# Altium footprint library PassiveComponents.PcbLib: 111 footprints (part 1 of 7)
Each footprint in its own frame and in the unit in brackets; x right, y up, seen from the top. Pads: shape width x height; smd on the part's side, far side on the other; paste and mask are expansions set on the pad; w line width, h text height; cw(c..) or ccw(c..) is an arc to the next point about the centre after c.
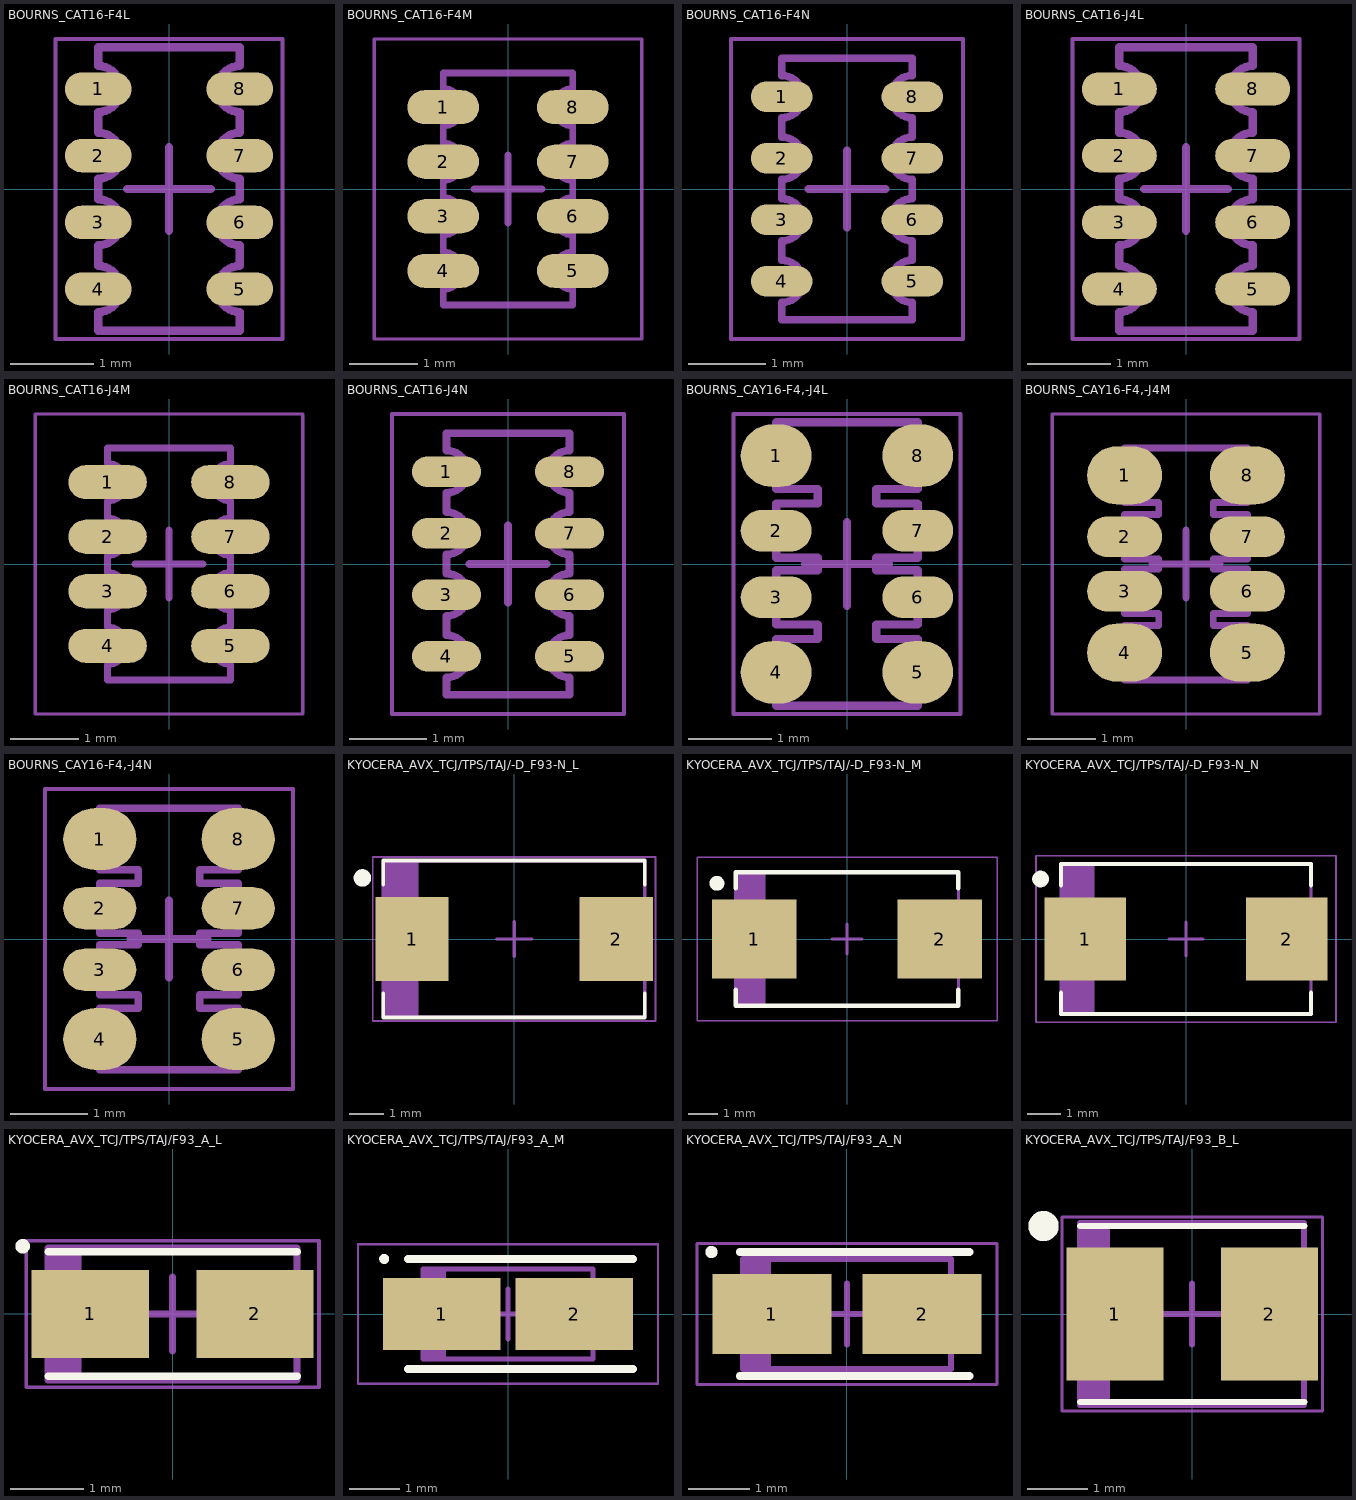
[diagram p0: the footprints below, top view; thin cyan lines are the x and y axes]

## BOURNS_CAT16-F4L [mm] "Chip Array, Concave, 8-Leads, Pitch 0.80mm,  Body 3.20x1.60mm,  IPC High Density"
height 0.6
pads (8):
  oval 0.8x0.4 smd mask+0.05: 1(-0.85,1.2) 2(-0.85,0.4) 3(-0.85,-0.4) 4(-0.85,-1.2) 5(0.85,-1.2) 6(0.85,-0.4) 7(0.85,0.4) 8(0.85,1.2)
Top Assembly:
  lines w0.1: -0.85,-1.7 0.85,-1.7 0.85,-1.475 cw(c0.85,-1.2) 0.85,-0.925 0.85,-0.675 cw(c0.85,-0.4) 0.85,-0.125 0.85,0.125 cw(c0.85,0.4) 0.85,0.675 0.85,0.925 cw(c0.85,1.2) 0.85,1.475 0.85,1.7 -0.85,1.7 -0.85,1.475 cw(c-0.85,1.2) -0.85,0.925 -0.85,0.675 cw(c-0.85,0.4) -0.85,0.125 -0.85,-0.125 cw(c-0.85,-0.4) -0.85,-0.675 -0.85,-0.925 cw(c-0.85,-1.2) -0.85,-1.475 -0.85,-1.7
  text "'.Designator'" at -0.113,1.209 h0.5
Top Courtyard:
  lines w0.05: -1.36,-1.8 1.36,-1.8 1.36,1.8 -1.36,1.8 -1.36,-1.8
  lines w0.1: -0.5,0 0.5,0 ; 0,-0.5 0,0.5
3D body "CAC-80P320X160-8L.step": height 0.6, standoff 0, extent -0.95,-1.7 0.95,1.7

## BOURNS_CAT16-F4M [mm] "Chip Array, Concave, 8-Leads, Pitch 0.80mm,  Body 3.20x1.60mm,  IPC Low Density"
height 0.6
pads (8):
  oval 1.05x0.5 smd mask+0.05: 1(-0.95,1.2) 2(-0.95,0.4) 3(-0.95,-0.4) 4(-0.95,-1.2) 5(0.95,-1.2) 6(0.95,-0.4) 7(0.95,0.4) 8(0.95,1.2)
Top Assembly:
  lines w0.1: -0.95,-1.7 0.95,-1.7 0.95,-1.475 cw(c0.95,-1.2) 0.95,-0.925 0.95,-0.675 cw(c0.95,-0.4) 0.95,-0.125 0.95,0.125 cw(c0.95,0.4) 0.95,0.675 0.95,0.925 cw(c0.95,1.2) 0.95,1.475 0.95,1.7 -0.95,1.7 -0.95,1.475 cw(c-0.95,1.2) -0.95,0.925 -0.95,0.675 cw(c-0.95,0.4) -0.95,0.125 -0.95,-0.125 cw(c-0.95,-0.4) -0.95,-0.675 -0.95,-0.925 cw(c-0.95,-1.2) -0.95,-1.475 -0.95,-1.7
  text "'.Designator'" at -0.113,1.209 h0.5
Top Courtyard:
  lines w0.05: -1.96,-2.2 1.96,-2.2 1.96,2.2 -1.96,2.2 -1.96,-2.2
  lines w0.1: -0.5,0 0.5,0 ; 0,-0.5 0,0.5
3D body "CAC-80P320X160-8M.step": height 0.6, standoff 0, extent -0.95,-1.7 0.95,1.7

## BOURNS_CAT16-F4N [mm] "Chip Array, Concave, 8-Leads, Pitch 0.80mm,  Body 3.20x1.60mm,  IPC Medium Density"
height 0.6
pads (8):
  oval 0.8x0.4 smd mask+0.05: 1(-0.85,1.2) 2(-0.85,0.4) 3(-0.85,-0.4) 4(-0.85,-1.2) 5(0.85,-1.2) 6(0.85,-0.4) 7(0.85,0.4) 8(0.85,1.2)
Top Assembly:
  lines w0.1: -0.85,-1.7 -0.85,-1.475 ccw(c-0.85,-1.2) -0.85,-0.925 -0.85,-0.675 ccw(c-0.85,-0.4) -0.85,-0.125 -0.85,0.125 ccw(c-0.85,0.4) -0.85,0.675 -0.85,0.925 ccw(c-0.85,1.2) -0.85,1.475 -0.85,1.7 0.85,1.7 0.85,1.475 ccw(c0.85,1.2) 0.85,0.925 0.85,0.675 ccw(c0.85,0.4) 0.85,0.125 0.85,-0.125 ccw(c0.85,-0.4) 0.85,-0.675 0.85,-0.925 ccw(c0.85,-1.2) 0.85,-1.475 0.85,-1.7 -0.85,-1.7
  text "'.Designator'" at -0.113,1.209 h0.5
Top Courtyard:
  lines w0.05: -1.51,-1.95 -1.51,1.95 1.51,1.95 1.51,-1.95 -1.51,-1.95
  lines w0.1: -0.5,0 0.5,0 ; 0,-0.5 0,0.5
3D body "CAC-80P320X160-8N.step": height 0.6, standoff 0, extent -0.95,-1.7 0.95,1.7

## BOURNS_CAT16-J4L [mm] "Chip Array, Concave, 8-Leads, Pitch 0.80mm,  Body 3.20x1.55mm,  IPC High Density"
height 0.6
pads (8):
  oval 0.9x0.4 smd mask+0.05: 1(-0.8,1.2) 2(-0.8,0.4) 3(-0.8,-0.4) 4(-0.8,-1.2) 5(0.8,-1.2) 6(0.8,-0.4) 7(0.8,0.4) 8(0.8,1.2)
Top Assembly:
  lines w0.1: -0.8,-1.7 0.8,-1.7 0.8,-1.475 cw(c0.8,-1.2) 0.8,-0.925 0.8,-0.675 cw(c0.8,-0.4) 0.8,-0.125 0.8,0.125 cw(c0.8,0.4) 0.8,0.675 0.8,0.925 cw(c0.8,1.2) 0.8,1.475 0.8,1.7 -0.8,1.7 -0.8,1.475 cw(c-0.8,1.2) -0.8,0.925 -0.8,0.675 cw(c-0.8,0.4) -0.8,0.125 -0.8,-0.125 cw(c-0.8,-0.4) -0.8,-0.675 -0.8,-0.925 cw(c-0.8,-1.2) -0.8,-1.475 -0.8,-1.7
  text "'.Designator'" at -0.113,1.209 h0.5
Top Courtyard:
  lines w0.05: -1.36,-1.8 1.36,-1.8 1.36,1.8 -1.36,1.8 -1.36,-1.8
  lines w0.1: -0.5,0 0.5,0 ; 0,-0.5 0,0.5
3D body "CAC-80P320X155-8L.step": height 0.6, standoff 0, extent -0.95,-1.7 0.95,1.7

## BOURNS_CAT16-J4M [mm] "Chip Array, Concave, 8-Leads, Pitch 0.80mm,  Body 3.20x1.55mm,  IPC Low Density"
height 0.6
pads (8):
  oval 1.15x0.5 smd mask+0.05: 1(-0.9,1.2) 2(-0.9,0.4) 3(-0.9,-0.4) 4(-0.9,-1.2) 5(0.9,-1.2) 6(0.9,-0.4) 7(0.9,0.4) 8(0.9,1.2)
Top Assembly:
  lines w0.1: -0.9,-1.7 0.9,-1.7 0.9,-1.475 cw(c0.9,-1.2) 0.9,-0.925 0.9,-0.675 cw(c0.9,-0.4) 0.9,-0.125 0.9,0.125 cw(c0.9,0.4) 0.9,0.675 0.9,0.925 cw(c0.9,1.2) 0.9,1.475 0.9,1.7 -0.9,1.7 -0.9,1.475 cw(c-0.9,1.2) -0.9,0.925 -0.9,0.675 cw(c-0.9,0.4) -0.9,0.125 -0.9,-0.125 cw(c-0.9,-0.4) -0.9,-0.675 -0.9,-0.925 cw(c-0.9,-1.2) -0.9,-1.475 -0.9,-1.7
  text "'.Designator'" at -0.113,1.209 h0.5
Top Courtyard:
  lines w0.05: -1.96,-2.2 1.96,-2.2 1.96,2.2 -1.96,2.2 -1.96,-2.2
  lines w0.1: -0.5,0 0.5,0 ; 0,-0.5 0,0.5
3D body "CAC-80P320X155-8M.step": height 0.6, standoff 0, extent -0.95,-1.7 0.95,1.7

## BOURNS_CAT16-J4N [mm] "Chip Array, Concave, 8-Leads, Pitch 0.80mm,  Body 3.20x1.55mm,  IPC Medium Density"
height 0.6
pads (8):
  oval 0.9x0.4 smd mask+0.05: 1(-0.8,1.2) 2(-0.8,0.4) 3(-0.8,-0.4) 4(-0.8,-1.2) 5(0.8,-1.2) 6(0.8,-0.4) 7(0.8,0.4) 8(0.8,1.2)
Top Assembly:
  lines w0.1: -0.8,-1.7 -0.8,-1.475 ccw(c-0.8,-1.2) -0.8,-0.925 -0.8,-0.675 ccw(c-0.8,-0.4) -0.8,-0.125 -0.8,0.125 ccw(c-0.8,0.4) -0.8,0.675 -0.8,0.925 ccw(c-0.8,1.2) -0.8,1.475 -0.8,1.7 0.8,1.7 0.8,1.475 ccw(c0.8,1.2) 0.8,0.925 0.8,0.675 ccw(c0.8,0.4) 0.8,0.125 0.8,-0.125 ccw(c0.8,-0.4) 0.8,-0.675 0.8,-0.925 ccw(c0.8,-1.2) 0.8,-1.475 0.8,-1.7 -0.8,-1.7
  text "'.Designator'" at -0.113,1.209 h0.5
Top Courtyard:
  lines w0.05: -1.51,-1.95 -1.51,1.95 1.51,1.95 1.51,-1.95 -1.51,-1.95
  lines w0.1: -0.5,0 0.5,0 ; 0,-0.5 0,0.5
3D body "CAC-80P320X155-8N.step": height 0.6, standoff 0, extent -0.95,-1.7 0.95,1.7

## BOURNS_CAY16-F4,-J4L [mm] "Chip Array, ConvexS, 8-Leads, Pitch 0.80mm,  Body 3.20x1.60mm,  IPC High Density"
height 0.6
pads (8):
  oval 0.85x0.75 smd mask+0.05: 1(-0.85,1.3) 4(-0.85,-1.3) 5(0.85,-1.3) 8(0.85,1.3)
  oval 0.85x0.5 smd mask+0.05: 2(-0.85,0.4) 3(-0.85,-0.4) 6(0.85,-0.4) 7(0.85,0.4)
Top Assembly:
  lines w0.1: -0.85,-1.7 0.85,-1.7 0.85,-0.9 0.35,-0.9 0.35,-0.725 0.85,-0.725 0.85,-0.075 0.35,-0.075 0.35,0.075 0.85,0.075 0.85,0.725 0.35,0.725 0.35,0.9 0.85,0.9 0.85,1.7 -0.85,1.7 -0.85,0.9 -0.35,0.9 -0.35,0.725 -0.85,0.725 -0.85,0.075 -0.35,0.075 -0.35,-0.075 -0.85,-0.075 -0.85,-0.725 -0.35,-0.725 -0.35,-0.9 -0.85,-0.9 -0.85,-1.7
  text "'.Designator'" at -0.113,1.209 h0.5
Top Courtyard:
  lines w0.05: -1.36,-1.8 1.36,-1.8 1.36,1.8 -1.36,1.8 -1.36,-1.8
  lines w0.1: -0.5,0 0.5,0 ; 0,-0.5 0,0.5
3D body "CAC-80P320X160-8L.step": height 0.6, standoff 0, extent -0.95,-1.7 0.95,1.7

## BOURNS_CAY16-F4,-J4M [mm] "Chip Array, ConvexS, 8-Leads, Pitch 0.80mm,  Body 3.20x1.60mm,  IPC Low Density"
height 0.6
pads (8):
  oval 1.1x0.85 smd mask+0.05: 1(-0.9,1.3) 4(-0.9,-1.3) 5(0.9,-1.3) 8(0.9,1.3)
  oval 1.1x0.6 smd mask+0.05: 2(-0.9,0.4) 3(-0.9,-0.4) 6(0.9,-0.4) 7(0.9,0.4)
Top Assembly:
  lines w0.1: -0.9,-1.7 -0.9,-0.9 -0.4,-0.9 -0.4,-0.725 -0.9,-0.725 -0.9,-0.075 -0.4,-0.075 -0.4,0.075 -0.9,0.075 -0.9,0.725 -0.4,0.725 -0.4,0.9 -0.9,0.9 -0.9,1.7 0.9,1.7 0.9,0.9 0.4,0.9 0.4,0.725 0.9,0.725 0.9,0.075 0.4,0.075 0.4,-0.075 0.9,-0.075 0.9,-0.725 0.4,-0.725 0.4,-0.9 0.9,-0.9 0.9,-1.7 -0.9,-1.7
  text "'.Designator'" at -0.113,1.209 h0.5
Top Courtyard:
  lines w0.05: -1.96,-2.2 -1.96,2.2 1.96,2.2 1.96,-2.2 -1.96,-2.2
  lines w0.1: -0.5,0 0.5,0 ; 0,-0.5 0,0.5
3D body "CAC-80P320X160-8M.step": height 0.6, standoff 0, extent -0.95,-1.7 0.95,1.7

## BOURNS_CAY16-F4,-J4N [mm] "Chip Array, ConvexS, 8-Leads, Pitch 0.80mm,  Body 3.20x1.60mm,  IPC Medium Density"
height 0.6
pads (8):
  oval 0.95x0.8 smd mask+0.05: 1(-0.9,1.3) 4(-0.9,-1.3) 5(0.9,-1.3) 8(0.9,1.3)
  oval 0.95x0.55 smd mask+0.05: 2(-0.9,0.4) 3(-0.9,-0.4) 6(0.9,-0.4) 7(0.9,0.4)
Top Assembly:
  lines w0.1: -0.9,-1.7 -0.9,-0.9 -0.4,-0.9 -0.4,-0.725 -0.9,-0.725 -0.9,-0.075 -0.4,-0.075 -0.4,0.075 -0.9,0.075 -0.9,0.725 -0.4,0.725 -0.4,0.9 -0.9,0.9 -0.9,1.7 0.9,1.7 0.9,0.9 0.4,0.9 0.4,0.725 0.9,0.725 0.9,0.075 0.4,0.075 0.4,-0.075 0.9,-0.075 0.9,-0.725 0.4,-0.725 0.4,-0.9 0.9,-0.9 0.9,-1.7 -0.9,-1.7
  text "'.Designator'" at -0.113,1.209 h0.5
Top Courtyard:
  lines w0.05: -1.61,-1.95 -1.61,1.95 1.61,1.95 1.61,-1.95 -1.61,-1.95
  lines w0.1: -0.5,0 0.5,0 ; 0,-0.5 0,0.5
3D body "CAC-80P320X160-8N.step": height 0.6, standoff 0, extent -0.95,-1.7 0.95,1.7

## KYOCERA_AVX_TCJ/TPS/TAJ/-D_F93-N_L [mm] "Molded Capacitor, 2-Leads, Body 7.30x4.35mm, IPC High Density"
height 3.1
pads (2):
  rect 2.1x2.4 smd mask+0.05: 1(-2.925,0) 2(2.925,0)
Top Overlay:
  circle w0.25: c-4.351,1.75 r0.125
  lines w0.102: -3.75,-1.551 -3.75,-2.25 3.75,-2.25 3.75,-1.551 ; -3.75,1.551 -3.75,2.25 3.75,2.25 3.75,1.551
Top Assembly:
  rectangle: -3.75,-2.25 -2.741,2.25
  lines w0.1: -3.75,-2.25 -3.75,2.25 3.75,2.25 3.75,-2.25 -3.75,-2.25
  text "'.Designator'" at -1.209,-0.113 h0.5
Top Courtyard:
  lines w0.05: -4.05,-2.35 -4.05,2.35 4.05,2.35 4.05,-2.35 -4.05,-2.35
  lines w0.1: -0.5,0 0.5,0 ; 0,-0.5 0,0.5
3D body "CAPMP7344X31L.step": height 3.1, standoff 0, extent -3.97,-2.25 3.97,2.25

## KYOCERA_AVX_TCJ/TPS/TAJ/-D_F93-N_M [mm] "Molded Capacitor, 2-Leads, Body 7.30x4.35mm, IPC Low Density"
height 3.1
pads (2):
  rect 2.85x2.65 smd mask+0.05: 1(-3.125,0) 2(3.125,0)
Top Overlay:
  circle w0.25: c-4.376,1.875 r0.125
  lines w0.152: -3.75,-1.701 -3.75,-2.25 3.75,-2.25 3.75,-1.701 ; -3.75,1.701 -3.75,2.25 3.75,2.25 3.75,1.701
Top Assembly:
  rectangle: -3.75,-2.25 -2.741,2.25
  lines w0.1: -3.75,-2.25 3.75,-2.25 3.75,2.25 -3.75,2.25 -3.75,-2.25
  text "'.Designator'" at -1.209,-0.113 h0.5
Top Courtyard:
  lines w0.05: -5.05,-2.75 5.05,-2.75 5.05,2.75 -5.05,2.75 -5.05,-2.75
  lines w0.1: -0.5,0 0.5,0 ; 0,-0.5 0,0.5
3D body "CAPMP7344X31M.step": height 3.1, standoff 0, extent -3.97,-2.25 3.97,2.25

## KYOCERA_AVX_TCJ/TPS/TAJ/-D_F93-N_N [mm] "Molded Capacitor, 2-Leads, Body 7.30x4.35mm, IPC Medium Density"
height 3.1
pads (2):
  rect 2.45x2.5 smd mask+0.05: 1(-3.025,0) 2(3.025,0)
Top Overlay:
  circle w0.25: c-4.363,1.8 r0.125
  lines w0.127: -3.75,-1.614 -3.75,-2.25 3.75,-2.25 3.75,-1.614 ; -3.75,1.614 -3.75,2.25 3.75,2.25 3.75,1.614
Top Assembly:
  rectangle: -3.75,-2.25 -2.741,2.25
  lines w0.1: -3.75,-2.25 -3.75,2.25 3.75,2.25 3.75,-2.25 -3.75,-2.25
  text "'.Designator'" at -1.209,-0.113 h0.5
Top Courtyard:
  lines w0.05: -4.5,-2.5 -4.5,2.5 4.5,2.5 4.5,-2.5 -4.5,-2.5
  lines w0.1: -0.5,0 0.5,0 ; 0,-0.5 0,0.5
3D body "CAPMP7344X31N.step": height 3.1, standoff 0, extent -3.97,-2.25 3.97,2.25

## KYOCERA_AVX_TCJ/TPS/TAJ/F93_A_L [mm] "Molded Capacitor, 2-Leads, Body 3.20x1.65mm, IPC High Density"
height 1.8
pads (2):
  rect 1.6x1.2 smd mask+0.05: 1(-1.125,0) 2(1.125,0)
Top Overlay:
  circle w0.1: c-2.048,0.925 r0.05
  lines w0.102: -1.7,-0.851 1.7,-0.851 ; -1.7,0.851 1.7,0.851
Top Assembly:
  rectangle: -1.7,-0.9 -1.243,0.9
  lines w0.1: -1.7,-0.9 1.7,-0.9 1.7,0.9 -1.7,0.9 -1.7,-0.9
  text "'.Designator'" at -1.209,-0.113 h0.5
Top Courtyard:
  lines w0.05: -2,-1 2,-1 2,1 -2,1 -2,-1
  lines w0.1: -0.5,0 0.5,0 ; 0,-0.5 0,0.5
3D body "CAPMP3216X18L.step": height 1.8, standoff 0, extent -1.92,-0.9 1.92,0.9

## KYOCERA_AVX_TCJ/TPS/TAJ/F93_A_M [mm] "Molded Capacitor, 2-Leads, Body 3.20x1.65mm, IPC Low Density"
height 1.8
pads (2):
  rect 2.35x1.45 smd mask+0.05: 1(-1.325,0) 2(1.325,0)
Top Overlay:
  circle w0.1: c-2.476,1.101 r0.05
  lines w0.152: -2,-1.101 2.5,-1.101 ; -2,1.101 2.5,1.101
Top Assembly:
  rectangle: -1.7,-0.9 -1.243,0.9
  lines w0.1: -1.7,-0.9 -1.7,0.9 1.7,0.9 1.7,-0.9 -1.7,-0.9
  text "'.Designator'" at -1.209,-0.113 h0.5
Top Courtyard:
  lines w0.05: -3,-1.4 -3,1.4 3,1.4 3,-1.4 -3,-1.4
  lines w0.1: -0.5,0 0.5,0 ; 0,-0.5 0,0.5
3D body "CAPMP3216X18M.step": height 1.8, standoff 0, extent -1.92,-0.9 1.92,0.9

## KYOCERA_AVX_TCJ/TPS/TAJ/F93_A_N [mm] "Molded Capacitor, 2-Leads, Body 3.20x1.65mm, IPC Medium Density"
height 1.8
pads (2):
  rect 1.95x1.3 smd mask+0.05: 1(-1.225,0) 2(1.225,0)
Top Overlay:
  circle w0.1: c-2.213,1.013 r0.05
  lines w0.127: -1.75,-1.014 2,-1.014 ; -1.75,1.014 2,1.014
Top Assembly:
  rectangle: -1.7,-0.9 -1.243,0.9
  lines w0.1: -1.7,-0.9 1.7,-0.9 1.7,0.9 -1.7,0.9 -1.7,-0.9
  text "'.Designator'" at -1.209,-0.113 h0.5
Top Courtyard:
  lines w0.05: -2.45,-1.15 2.45,-1.15 2.45,1.15 -2.45,1.15 -2.45,-1.15
  lines w0.1: -0.5,0 0.5,0 ; 0,-0.5 0,0.5
3D body "CAPMP3216X18N.step": height 1.8, standoff 0, extent -1.92,-0.9 1.92,0.9

## KYOCERA_AVX_TCJ/TPS/TAJ/F93_B_L [mm] "Molded Capacitor, 2-Leads, Body 3.50x2.85mm, IPC High Density"
height 2.1
pads (2):
  rect 1.6x2.2 smd mask+0.05: 1(-1.275,0) 2(1.275,0)
Top Overlay:
  circle w0.25: c-2.451,1.451 r0.125
  lines w0.102: -1.85,-1.451 1.85,-1.451 ; -1.85,1.451 1.85,1.451
Top Assembly:
  rectangle: -1.85,-1.5 -1.352,1.5
  lines w0.1: -1.85,-1.5 -1.85,1.5 1.85,1.5 1.85,-1.5 -1.85,-1.5
  text "'.Designator'" at -1.209,-0.113 h0.5
Top Courtyard:
  lines w0.05: -2.15,-1.6 -2.15,1.6 2.15,1.6 2.15,-1.6 -2.15,-1.6
  lines w0.1: -0.5,0 0.5,0 ; 0,-0.5 0,0.5
3D body "CAPMP3528X21L.step": height 2.1, standoff 0, extent -2.07,-1.5 2.07,1.5